# Altium footprint library Minh_Lib.PcbLib: 141 footprints (part 1 of 9)
Each footprint in its own frame and in the unit in brackets; x right, y up, seen from the top. Pads: shape width x height; smd on the part's side, far side on the other; paste and mask are expansions set on the pad; w line width, h text height; cw(c..) or ccw(c..) is an arc to the next point about the centre after c.
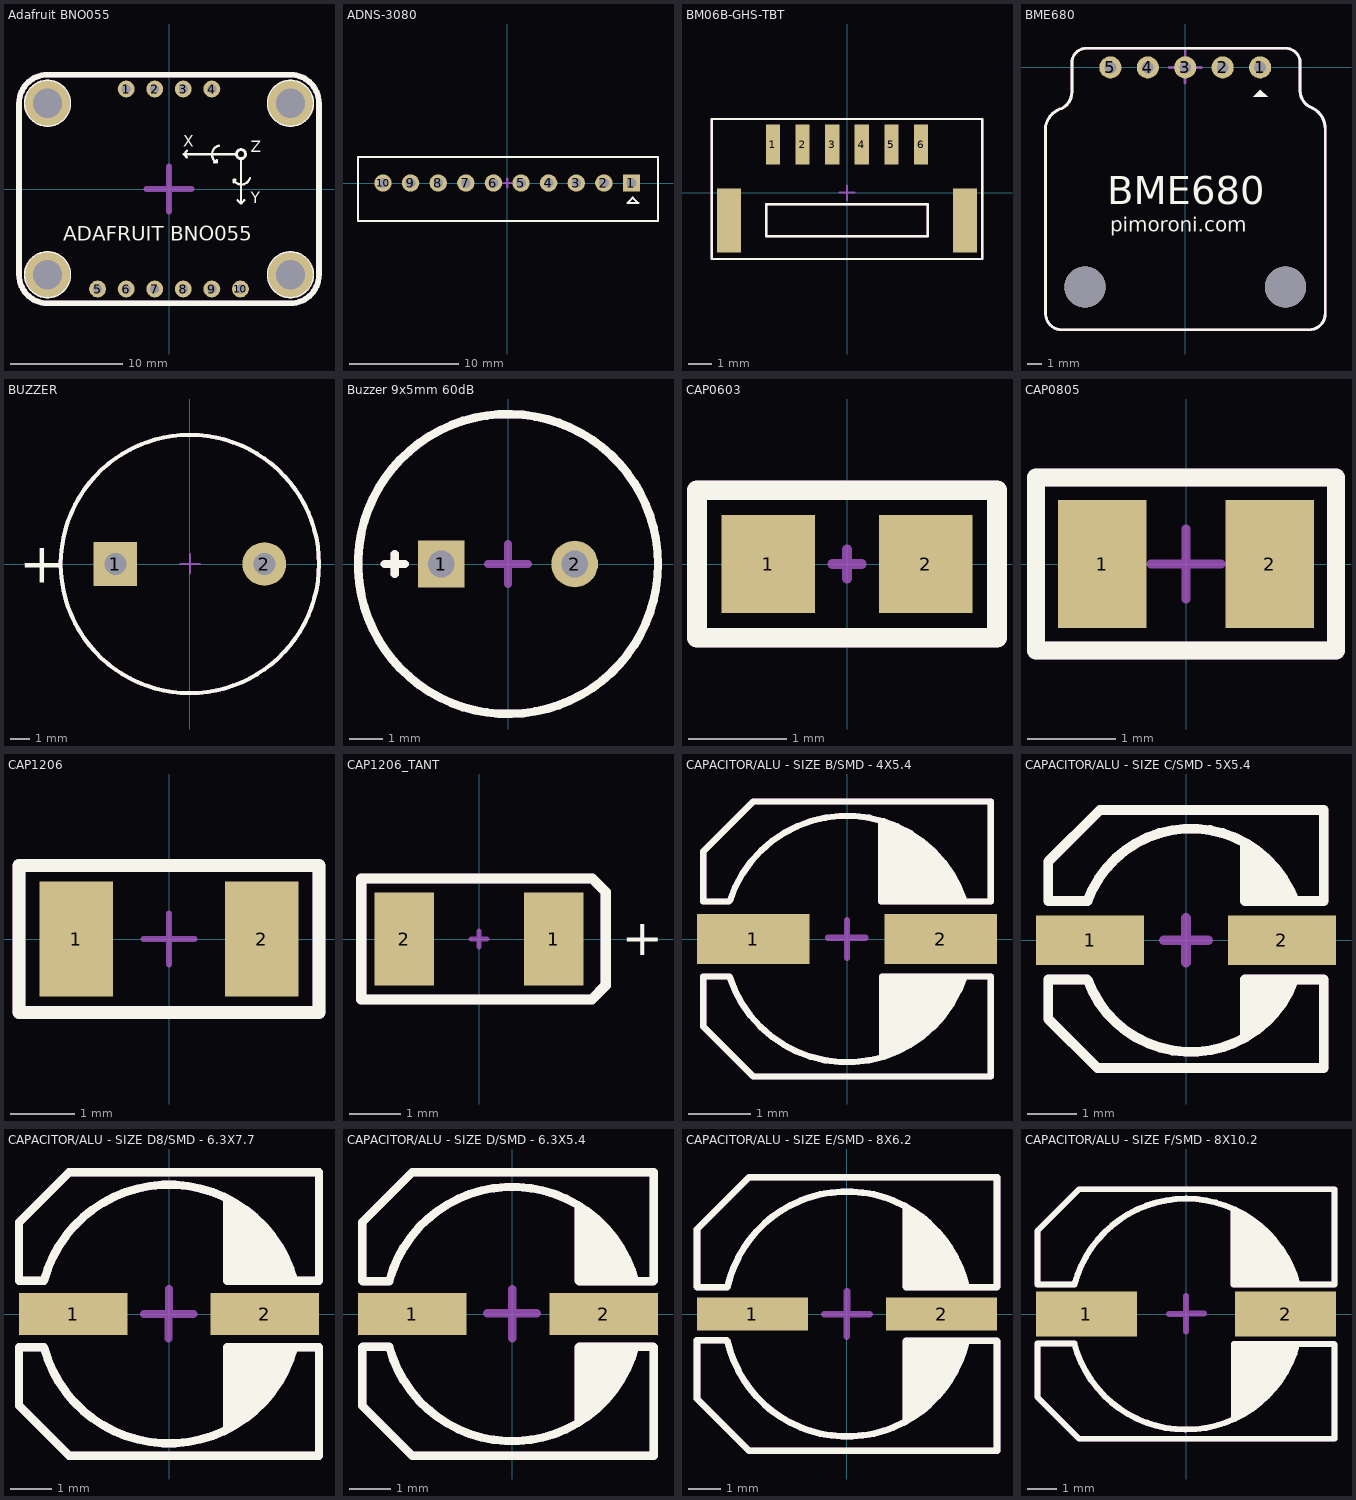
[diagram p0: the footprints below, top view; thin cyan lines are the x and y axes]

## Adafruit BNO055 [mm] "Adafruit BNO055"
pads (14):
  round 1.5 hole 0.8: 1(-3.81,8.89) 2(-1.27,8.89) 3(1.27,8.89) 4(3.81,8.89) 5(-6.35,-8.89) 6(-3.81,-8.89) 7(-1.27,-8.89) 8(1.27,-8.89) 9(3.81,-8.89) 10(6.35,-8.89)
  round 4 hole 2.6: ""(-10.795,-7.62) ""(-10.795,7.62) ""(10.795,-7.62) ""(10.795,7.62)
Top Overlay:
  circle w0.4: c10.795,7.62 r1.9
  circle w0.4: c10.795,-7.62 r1.9
  circle w0.4: c-10.795,-7.62 r1.9
  circle w0.4: c-10.795,7.62 r1.9
  circle w0.254: c6.4,3.1 r0.403
  lines w0.2: 1.603,2.8 1.303,3.1 ; 1.603,3.4 1.303,3.1 ; 4.024,2.374 4.236,2.374 ; 4.236,2.586 4.236,2.374 ; 4.427,3.851 ccw(c4.621,3.075) 4.236,2.374 ; 5.724,0.6 5.724,0.813 ; 5.913,0.813 5.724,0.813 ; 6,3.1 1.303,3.1 ; 6.1,-1 6.4,-1.3 ; 6.4,2.7 6.4,-1.3 ; 6.7,-1 6.4,-1.3 ; 7.194,0.98 cw(c6.425,1.2) 5.724,0.813
  lines w0.5: -13.335,-7.62 ccw(c-10.795,-7.62) -10.795,-10.16 0,-10.16 10.795,-10.16 ccw(c10.795,-7.62) 13.335,-7.62 13.335,0 13.335,7.62 ccw(c10.795,7.62) 10.795,10.16 0,10.16 -10.795,10.16 ccw(c-10.795,7.62) -13.335,7.62 -13.335,0 -13.335,-7.62
  text "ADAFRUIT BNO055" at -9.4,-4.6 h1.3
  text "X" at 1.254,3.754 h1
  text "Z" at 7.254,3.254 h1
  text "Y" at 7.254,-1.246 h1
Mechanical 13:
  text "'.Designator'" at -11.5,-6.8 h3
Mechanical 15:
  circle w0.4: c10.795,7.62 r1.9
  circle w0.4: c10.795,-7.62 r1.9
  circle w0.4: c-10.795,-7.62 r1.9
  circle w0.4: c-10.795,7.62 r1.9
  lines w0.5: -2,0 0,0 ; 0,-2 0,0 ; 0,2 0,0 ; 2,0 0,0 ; -13.335,-7.62 ccw(c-10.795,-7.62) -10.795,-10.16 0,-10.16 10.795,-10.16 ccw(c10.795,-7.62) 13.335,-7.62 13.335,0 13.335,7.62 ccw(c10.795,7.62) 10.795,10.16 0,10.16 -10.795,10.16 ccw(c-10.795,7.62) -13.335,7.62 -13.335,0 -13.335,-7.62
3D body "2472 BNO055 Breakout.step": height 11.23, standoff 7, extent -13.335,-10.16 13.335,10.16
3D body "4x_Male_Pin_2.54_mm.STEP": height 10.04, standoff -1.06, extent -5.08,7.67 5.08,10.07
3D body "6x_Male_Pin_2.54_mm.STEP": height 10.04, standoff -1.06, extent -7.62,-10.09 7.62,-7.69
3D body "4-Pin Header - Female - 2.54mm.step": height 5, standoff -3, extent -5.33,7.62 5.33,10.12
3D body "6-Pin Header - Female - 2.54mm.step": height 5, standoff -3, extent -7.87,-10.14 7.87,-7.64

## ADNS-3080 [mm] "10 PIN DIP"
pads (10):
  rect 1.6x1.6 hole 0.9: 1(11.43,0)
  round 1.6 hole 0.9: 2(8.89,0) 3(6.35,0) 4(3.81,0) 5(1.27,0) 6(-1.27,0) 7(-3.81,0) 8(-6.35,0) 9(-8.89,0) 10(-11.43,0)
Top Overlay:
  lines w0.2: -13.73,-3.5 13.87,-3.5 13.87,2.4 -13.73,2.4 -13.73,-3.5 ; 11.05,-1.85 12.05,-1.85 11.55,-1.35 11.05,-1.85
Mechanical 13:
  lines w0.2: -13.73,-3.5 13.87,-3.5 13.87,2.4 -13.73,2.4 -13.73,-3.5 ; 11.05,-1.85 12.05,-1.85 11.55,-1.35 11.05,-1.85
  text "'.Designator'" at -13.05,-2.4 h1.8
Mechanical 15:
  lines w0.2: -0.4,0 0,0 ; 0,-0.4 0,0 ; 0,0.4 0,0 ; 0.4,0 0,0
3D body "User Library-B10B-XH_mod.step": height 7, standoff -3.3, extent -13.6,-3.4 13.8,2.35

## BM06B-GHS-TBT [mm] "JST - GH - 6 PORT"
pads (8):
  rect 0.6x1.7 smd: 1(-3.125,2.025) 2(-1.875,2.025) 3(-0.625,2.025) 4(0.625,2.025) 5(1.875,2.025) 6(3.125,2.025)
  rect 1x2.7 smd: ""(-4.975,-1.175) ""(4.975,-1.175)
Top Overlay:
  lines w0.1: -3.4,-1.2 -3.4,-1.175 ; -3.4,-0.85 -3.4,-0.8 ; -1.4,-0.5 -1.35,-0.5 ; 1.4,-0.5 1.45,-0.5 ; 2.95,-1.85 3,-1.85 ; 3.35,-1.85 3.4,-1.85 ; 3.4,-1.8 3.4,-1.85 ; 3.4,-1.5 3.4,-1.45 ; 3.4,-1.175 3.4,-1.15 ; 3.4,-1.85 3.4,-0.5 -3.4,-0.5 -3.4,-1.85 3.4,-1.85 ; -5.7,-2.8 -5.7,3.1 -3.1,3.1 5.7,3.1 5.7,-2.8 -5.7,-2.8 ; -3.4,-1.55 -3.4,-1.55
Mechanical 13:
  lines w0.1: -3.4,-1.2 -3.4,-1.175 ; -3.4,-0.85 -3.4,-0.8 ; -1.4,-0.5 -1.35,-0.5 ; 1.4,-0.5 1.45,-0.5 ; 2.95,-1.85 3,-1.85 ; 3.35,-1.85 3.4,-1.85 ; 3.4,-1.8 3.4,-1.85 ; 3.4,-1.5 3.4,-1.45 ; 3.4,-1.175 3.4,-1.15 ; 3.4,-1.85 3.4,-0.5 -3.4,-0.5 -3.4,-1.85 3.4,-1.85 ; -5.7,-2.8 -5.7,3.1 -3.1,3.1 5.7,3.1 5.7,-2.8 -5.7,-2.8 ; -3.4,-1.55 -3.4,-1.55
  text "'.Designator'" at -5.15,-0.1 h1.2
Mechanical 15:
  lines w0.1: -0.3,0 0,0 ; 0,-0.3 0,0 ; 0,0.3 0,0 ; 0.3,0 0,0
3D body "BM06B-GHS-TBT.STEP": height 4.2, standoff -0.01, extent -5.375,-2.3 5.375,2.65

## BME680 [mm] "Pimoroni Robot"
pads (7):
  round 1.5 hole 0.8: 1(5.08,0) 2(2.54,0) 3(0,0) 4(-2.54,0) 5(-5.08,0)
  round 2.8 hole 2.8: ""(-6.8,-14.9) ""(6.8,-14.9)
Top Overlay:
  region: 5.1,-1.5 4.6,-2 5.6,-2
  lines w0.2: -9.48,-4.005 -9.48,-16.7 ccw(c-8.39,-16.71) -8.4,-17.8 8.4,-17.8 ccw(c8.4,-16.7) 9.5,-16.7 9.5,-4.2 ccw(c7.95,-4.15) 8.477,-2.691 ; -9.478,-4.005 cw(c-7.95,-4.27) -8.355,-2.773 ; -8.345,-2.768 ccw(c-8.915,-1.696) -7.701,-1.674 ; -7.7,-1.73 -7.7,0.3 cw(c-6.7,0.3) -6.7,1.3 6.8,1.3 cw(c6.8,0.3) 7.8,0.3 7.8,-1.6 ccw(c9.014,-1.6) 8.599,-2.741
  text "BME680" at -5.3,-9.3 h1.9
  text "pimoroni.com" at -5.1,-11.167 h1
Mechanical 13:
  lines w0.2: -9.48,-4.005 -9.48,-16.7 ccw(c-8.39,-16.71) -8.4,-17.8 8.4,-17.8 ccw(c8.4,-16.7) 9.5,-16.7 9.5,-4.2 ccw(c7.95,-4.15) 8.477,-2.691 ; -9.478,-4.005 cw(c-7.95,-4.27) -8.355,-2.773 ; -8.345,-2.768 ccw(c-8.915,-1.696) -7.701,-1.674 ; -7.7,-1.73 -7.7,0.3 cw(c-6.7,0.3) -6.7,1.3 6.8,1.3 cw(c6.8,0.3) 7.8,0.3 7.8,-1.6 ccw(c9.014,-1.6) 8.599,-2.741
  text "'.Designator'" at -9.2,-16.7 h1.8
Mechanical 15:
  lines w0.2: -1.1,0 0,0 0,1.1 ; -0.004,-1.061 -0.004,0.039 ; -0.004,0 1.096,0
3D body "BME680.STEP": height 8.97, standoff 7.3, extent -9.5,-17.79 9.5,1.21
3D body "User Library-LGA8-3x3mm.STEP": height 9.84, standoff 8.91, extent -1.51,-16.35 1.49,-13.35
3D body "rnd_150-0402y103z250nu.stp": height 9.5, standoff 9, extent 7.5,-6.5 8,-5.5
3D body "User Library-User Library-RES0402-2.STEP": height 9.35, standoff 9, extent -6.75,-6 -6.25,-5
3D body "rnd_150-0402y103z250nu.stp": height 9.5, standoff 9, extent 2.4,-6 2.9,-5
3D body "rnd_150-0402y103z250nu.stp": height 9.5, standoff 9, extent 2.5,-15.3 3,-14.3
3D body "rnd_150-0402y103z250nu.stp": height 9.5, standoff 9, extent -3,-15.3 -2.5,-14.3
3D body "User Library-YC124.STEP": height 9.36, standoff 9, extent -3.7,-6 -1.7,-5
3D body "45965.stp": height 10.11, standoff 8.95, extent -1,-6.95 1.8,-4.05
3D body "CircuitWorks-SOT-23.STEP": height 10.05, standoff 8.95, extent 3.5,-6.75 6.5,-4.25
3D body "User Library-User Library-RES0402-2.STEP": height 9.35, standoff 9, extent -5.25,-6 -4.75,-5
3D body "5-Pin Header - Female - 2.54mm.step": height 5, standoff -3, extent -6.57,-1.25 6.63,1.25
3D body "5x_Male_Pin_2.54_mm.STEP": height 10.11, standoff -0.99, extent -6.35,-1.2 6.35,1.2

## BUZZER [mm]
pads (2):
  rect 2.2x2.2 hole 1.1: 1(-3.75,0)
  round 2.2 hole 1.1: 2(3.75,0)
Top Overlay:
  circle w0.203: c0,0 r6.5
  text "+" at -8.6,-0.95 h2
Mechanical 13:
  circle w0.203: c0,0 r6.5
  text "+" at -8.6,-0.95 h2
  text "'.Designator'" at -5.95,-0.7 h1.5
Mechanical 15:
  lines w0.1: -0.5,0 0,0 0,0.5 ; -0.001,-0.49 -0.001,0.01 0.499,0.01
3D body "Altavoz.STEP": height 5.74, standoff -10.16, extent -6,-5.925 5.85,5.925

## Buzzer 9x5mm 60dB [mm] "9050 DIP"
pads (2):
  rect 1.4x1.4 hole 0.8: 1(-2,0)
  round 1.4 hole 0.8: 2(2,0)
Top Overlay:
  circle w0.254: c0,0 r4.5
  lines w0.254: -3.7,0 -3.4,0 ; -3.4,-0.3 -3.4,0 ; -3.4,0.3 -3.4,0 ; -3.1,0 -3.4,0
Mechanical 13:
  circle w0.254: c0,0 r4.5
  lines w0.254: -3.7,0 -3.4,0 ; -3.4,-0.3 -3.4,0 ; -3.4,0.3 -3.4,0 ; -3.1,0 -3.4,0
  text "'.Designator'" at -3.9,-1.65 h1.5
Mechanical 15:
  lines w0.254: -0.6,0 0,0 ; 0,-0.6 0,0 ; 0,0.6 0,0 ; 0.6,0 0,0
3D body "buzzer.STEP": height 5.5, standoff -4.5, extent -4.5,-4.5 4.5,4.5

## CAP0603 [mm] "Capacitor SMD 0603 ( imperal )"
pads (2):
  rect 0.95x1 smd: 1(-0.8,0) 2(0.8,0)
Top Overlay:
  lines w0.2: -1.525,-0.75 1.525,-0.75 1.525,0.75 -1.525,0.75 -1.525,-0.75
Mechanical 13:
  lines w0.2: -1.525,-0.75 -1.525,0.75 1.525,0.75 1.525,-0.75 -1.525,-0.75
  text "'.Designator'" at -1.325,-0.317 h0.7
Mechanical 15:
  lines w0.1: -0.15,0 0.15,0 ; 0,-0.15 0,0.15
3D body "74467.stp": height 0.9, standoff 0.03, extent -0.875,-0.47 0.875,0.48

## CAP0805 [mm]
pads (2):
  rect 1x1.45 smd: 1(-0.95,0) 2(0.95,0)
Top Overlay:
  lines w0.2: -1.7,-0.98 1.7,-0.98 1.7,0.98 -1.7,0.98 -1.7,-0.98
Mechanical 13:
  lines w0.2: -1.7,-0.98 1.7,-0.98 1.7,0.98 -1.7,0.98 -1.7,-0.98
  text "'.Designator'" at -1.59,-0.647 h0.7
Mechanical 15:
  lines w0.1: -0.4,0 0.4,0 ; 0,-0.4 0,0.4
3D body "74655.stp": height 0.87, standoff -0.01, extent -1.1,-0.72 1.1,0.73

## CAP1206 [mm]
pads (2):
  rect 1.15x1.8 smd: 1(-1.45,0) 2(1.45,0)
Top Overlay:
  lines w0.2: -2.35,-1.15 -2.35,1.15 2.35,1.15 2.35,-1.15 -2.35,-1.15
Mechanical 13:
  lines w0.2: -2.35,-1.15 -2.35,1.15 2.35,1.15 2.35,-1.15 -2.35,-1.15
  text "'.Designator'" at -2.15,-0.717 h0.7
Mechanical 15:
  lines w0.1: -0.4,0 0.4,0 ; 0,-0.4 0,0.4
3D body "User Library-CAPC3216X10.STEP": height 1, standoff 0, extent -1.6,-0.8 1.6,0.8

## CAP1206_TANT [mm]
pads (2):
  rect 1.15x1.8 smd: 1(1.45,0) 2(-1.45,0)
Top Overlay:
  lines w0.1: 2.462,0.85 2.462,0.85
  lines w0.2: -2.288,-1.175 2.187,-1.175 2.462,-0.9 2.462,0.85 2.462,0.9 2.462,0.913 2.2,1.175 -2.288,1.175 -2.288,-1.175
  text "+" at 2.775,-0.317 h0.7
Mechanical 13:
  lines w0.1: 2.462,0.85 2.462,0.85
  lines w0.2: -2.288,-1.175 2.187,-1.175 2.462,-0.9 2.462,0.85 2.462,0.9 2.462,0.913 2.2,1.175 -2.288,1.175 -2.288,-1.175
  text "'.Designator'" at -2.025,-0.242 h0.7
Mechanical 15:
  lines w0.1: -0.15,0 0.15,0 ; 0,-0.15 0,0.15
3D body "User Library-CAP_TAN_C3216_1206.STEP": height 1.81, standoff 0.01, extent -1.7,-0.9 1.7,0.9

## CAPACITOR/ALU - SIZE B/SMD - 4X5.4 [mm] "CAPACITOR  -  ALUMINIUM - SIZE B / EEEFK - SMD"
pads (2):
  rect 1.8x0.8 smd: 1(-1.5,0) 2(1.5,0)
Top Overlay:
  region: 0.563,-1.88 0.563,-0.6 1.872,-0.6 1.81,-0.672 1.77,-0.9 1.56,-1.16 1.56,-1.24 1.21,-1.59 1.045,-1.675 0.82,-1.79
  region: 0.55,0.6 0.55,1.89 0.67,1.89 0.81,1.75 0.99,1.75 1.28,1.46 1.33,1.46 1.64,1.14 1.64,1.09 1.78,0.95 1.879,0.6
  lines w0.1: -1.888,0.6 -2.3,0.6 -2.3,1.4 -1.5,2.2 2.3,2.2 2.3,0.6 1.879,0.6 ; -1.88,-0.6 -2.3,-0.6 -2.3,-1.4 -1.5,-2.2 2.3,-2.2 2.3,-0.6 1.838,-0.6 ; -1.879,-0.6 ccw(c0,0) 1.877,-0.605 ; -1.874,0.613 cw(c0,0) 1.879,0.6 ; 0.55,1.89 0.55,0.6 ; 0.563,-1.88 0.563,-0.6 1.861,-0.6 ; 0.55,0.6 0.55,0.6 ; 0.55,0.6 1.879,0.6
Mechanical 13:
  region: 0.563,-1.88 0.563,-0.6 1.872,-0.6 1.81,-0.672 1.77,-0.9 1.56,-1.16 1.56,-1.24 1.21,-1.59 1.045,-1.675 0.82,-1.79
  region: 0.55,0.6 0.55,1.89 0.67,1.89 0.81,1.75 0.99,1.75 1.28,1.46 1.33,1.46 1.64,1.14 1.64,1.09 1.78,0.95 1.879,0.6
  lines w0.1: -1.888,0.6 -2.3,0.6 -2.3,1.4 -1.5,2.2 2.3,2.2 2.3,0.6 1.879,0.6 ; -1.88,-0.6 -2.3,-0.6 -2.3,-1.4 -1.5,-2.2 2.3,-2.2 2.3,-0.6 1.838,-0.6 ; -1.879,-0.6 ccw(c0,0) 1.877,-0.605 ; -1.874,0.613 cw(c0,0) 1.879,0.6 ; 0.55,1.89 0.55,0.6 ; 0.563,-1.88 0.563,-0.6 1.861,-0.6 ; 0.55,0.6 0.55,0.6 ; 0.55,0.6 1.879,0.6
  text "'.Designator'" at -2.22,-0.27 h0.6
Mechanical 15:
  lines w0.1: -0.304,0.02 -0.004,0.02 0.296,0.02 ; 0,-0.3 0,0 0,0.3
3D body "User Library-capacitor size B.step": height 5.41, standoff -0.01, extent -2.3,-2.15 2.3,2.15

## CAPACITOR/ALU - SIZE C/SMD - 5X5.4 [mm] "CAPACITOR  -  ALUMINIUM - SIZE C / EEEFK - SMD"
pads (2):
  rect 2.2x1 smd: 1(-1.95,0) 2(1.95,0)
Top Overlay:
  region: 1.2,-0.8 1.2,-1.9 1.3,-1.9 1.85,-1.35 1.85,-1.3 2.2,-0.95 2.2,-0.8
  region: 1.2,1.999 1.2,0.801 2.203,0.801 1.799,1.4
  lines w0.2: -2.016,-0.8 -2.4,-0.8 -2.8,-0.8 -2.8,-1.6 -1.8,-2.6 -1.4,-2.6 2.8,-2.6 2.8,-0.8 2.2,-0.8 ; -1.995,-0.821 ccw(c0.099,-0.036) 2.2,-0.8 ; 1.2,-1.9 1.2,-0.8 2.2,-0.8 ; 1.2,1.9 1.2,0.801 2.203,0.801 ; 2.799,0.801 2.203,0.801 ; 2.8,0.8 2.8,2.65 -1.4,2.65 -1.75,2.65 -2.8,1.6 -2.8,0.8 -2.4,0.8 -2,0.8 cw(c0.101,0.036) 2.203,0.801
Mechanical 13:
  region: 1.2,-0.8 1.2,-1.9 1.3,-1.9 1.85,-1.35 1.85,-1.3 2.2,-0.95 2.2,-0.8
  region: 1.2,1.999 1.2,0.801 2.203,0.801 1.799,1.4
  lines w0.2: -2.016,-0.8 -2.4,-0.8 -2.8,-0.8 -2.8,-1.6 -1.8,-2.6 -1.4,-2.6 2.8,-2.6 2.8,-0.8 2.2,-0.8 ; -1.995,-0.821 ccw(c0.099,-0.036) 2.2,-0.8 ; 1.2,-1.9 1.2,-0.8 2.2,-0.8 ; 1.2,1.9 1.2,0.801 2.203,0.801 ; 2.799,0.801 2.203,0.801 ; 2.8,0.8 2.8,2.65 -1.4,2.65 -1.75,2.65 -2.8,1.6 -2.8,0.8 -2.4,0.8 -2,0.8 cw(c0.101,0.036) 2.203,0.801
  text "'.Designator'" at -2.85,-0.633 h0.8
Mechanical 15:
  lines w0.2: -0.45,0 0,0 ; 0,-0.45 0,0 ; 0,0.45 0,0 ; 0.45,0 0,0
3D body "User Library-capacitor size C.step": height 5.45, standoff 0.03, extent -2.9,-2.65 3,2.65

## CAPACITOR/ALU - SIZE D8/SMD - 6.3X7.7 [mm] "CAPACITOR  -  ALUMINIUM - SIZE D8 / EEEFK - SMD"
pads (2):
  rect 2.6x1 smd: 1(-2.3,0) 2(2.3,0)
Top Overlay:
  region: 1.4,2.7 1.4,0.8 3,0.8 2.9,1.2 2.3,2 2.3,2.1
  region: 1.4,-0.8 1.4,-2.7 1.5,-2.6 1.8,-2.6 2.3,-2.1 2.3,-2 2.8,-1.5 2.8,-1.2 3,-1 3,-0.8
  lines w0.2: 1.4,-2.7 1.4,-0.8 3,-0.8 ; 1.4,2.7 1.4,0.8 3,0.8 ; 3,-0.8 cw(c0,0) -3,-0.8 -3.6,-0.8 -3.6,-2.2 -2.4,-3.4 3.6,-3.4 3.6,-0.8 3,-0.8 ; 3,0.8 ccw(c0,0) -3,0.8 -3.6,0.8 -3.6,2.2 -2.4,3.4 3.6,3.4 3.6,0.8 3,0.8
Mechanical 13:
  region: 1.4,2.7 1.4,0.8 3,0.8 2.9,1.2 2.3,2 2.3,2.1
  region: 1.4,-0.8 1.4,-2.7 1.5,-2.6 1.8,-2.6 2.3,-2.1 2.3,-2 2.8,-1.5 2.8,-1.2 3,-1 3,-0.8
  lines w0.2: 1.4,-2.7 1.4,-0.8 3,-0.8 ; 1.4,2.7 1.4,0.8 3,0.8 ; 3,-0.8 cw(c0,0) -3,-0.8 -3.6,-0.8 -3.6,-2.2 -2.4,-3.4 3.6,-3.4 3.6,-0.8 3,-0.8 ; 3,0.8 ccw(c0,0) -3,0.8 -3.6,0.8 -3.6,2.2 -2.4,3.4 3.6,3.4 3.6,0.8 3,0.8
  text "'.Designator'" at -3.5,-0.3 h1.2
Mechanical 15:
  lines w0.2: -0.6,0 0,0 0,0.6 ; -0.013,-0.586 -0.013,0.014 ; -0.013,0 0.587,0
3D body "User Library-capacitor size D8.step": height 7.71, standoff -0.01, extent -3.5,-3.3 3.5,3.3

## CAPACITOR/ALU - SIZE D/SMD - 6.3X5.4 [mm] "CAPACITOR  -  ALUMINIUM - SIZE D / EEEFK - SMD"
pads (2):
  rect 2.6x1 smd: 1(-2.4,0) 2(2.2,0)
Top Overlay:
  region: 1.6,-2.6 1.6,-0.8 1.613,-0.787 2.95,-0.787 2.95,-1.05 2.7,-1.5
  region: 1.6,2.6 1.6,0.8 1.613,0.787 2.95,0.787 2.95,1.05 2.6,1.6 2.4,1.8
  lines w0.2: -3.6,-0.8 -3.6,-2.2 -2.4,-3.4 3.4,-3.4 3.4,-0.8 ; -3.6,0.8 -3.6,2.2 -2.4,3.4 3.4,3.4 3.4,0.8 ; -3.587,-0.787 -2.95,-0.787 ccw(c0,0) 2.95,-0.787 ; -3.587,0.787 -2.95,0.787 cw(c0,0) 2.95,0.787 ; 1.6,-2.6 1.6,-0.8 1.613,-0.787 2.95,-0.787 ; 1.6,2.6 1.6,0.8 1.613,0.787 2.95,0.787 ; 3.387,-0.787 2.95,-0.787 ; 3.387,0.787 2.95,0.787
Mechanical 13:
  region: 1.6,-2.6 1.6,-0.8 1.613,-0.787 2.95,-0.787 2.95,-1.05 2.7,-1.5
  region: 1.6,2.6 1.6,0.8 1.613,0.787 2.95,0.787 2.95,1.05 2.6,1.6 2.4,1.8
  lines w0.2: -3.6,-0.8 -3.6,-2.2 -2.4,-3.4 3.4,-3.4 3.4,-0.8 ; -3.6,0.8 -3.6,2.2 -2.4,3.4 3.4,3.4 3.4,0.8 ; -3.587,-0.787 -2.95,-0.787 ccw(c0,0) 2.95,-0.787 ; -3.587,0.787 -2.95,0.787 cw(c0,0) 2.95,0.787 ; 1.6,-2.6 1.6,-0.8 1.613,-0.787 2.95,-0.787 ; 1.6,2.6 1.6,0.8 1.613,0.787 2.95,0.787 ; 3.387,-0.787 2.95,-0.787 ; 3.387,0.787 2.95,0.787
  text "'.Designator'" at -3.45,-0.3 h1.2
Mechanical 15:
  lines w0.2: -0.598,0.017 0.002,0.017 ; -0.007,0.017 0.593,0.017 ; 0,-0.583 0,0.017 ; 0,0 0,0.6
3D body "User Library-capacitor size D.step": height 5.45, standoff 0.03, extent -3.6,-3.3 3.4,3.3

## CAPACITOR/ALU - SIZE E/SMD - 8X6.2 [mm] "CAPACITOR  -  ALUMINIUM - SIZE E / EEEFK - SMD"
pads (2):
  rect 3.4x1 smd: 1(-2.9,0) 2(2.9,0)
Top Overlay:
  region: 1.8,-3.298 1.8,-0.83 3.653,-0.83 3.6,-0.883 3.6,-1.3 3.3,-1.6 3.3,-1.9 3,-2.2 3,-2.3 2.9,-2.3 2.7,-2.5
  region: 1.8,3.298 1.8,0.83 1.815,0.815 3.668,0.815 3.668,1.032 3.5,1.2 3.5,1.6 3,2.1 3,2.3 2.8,2.5
  lines w0.2: -3.683,-0.8 -4.6,-0.8 -4.6,-2.6 -3,-4.2 4.6,-4.2 4.6,-0.83 4.585,-0.815 3.668,-0.815 ; -3.668,-0.815 ccw(c0,0) 3.668,-0.815 ; 1.8,-3.3 1.8,-0.83 1.815,-0.815 3.668,-0.815 ; 1.8,3.3 1.8,0.83 1.815,0.815 3.668,0.815 ; 3.668,0.815 ccw(c0,0) -3.668,0.815 -4.585,0.815 -4.6,0.83 -4.6,2.6 -3,4.2 4.4,4.2 4.6,4.2 4.6,0.83 4.585,0.815 3.668,0.815
Mechanical 13:
  region: 1.8,-3.298 1.8,-0.83 3.653,-0.83 3.6,-0.883 3.6,-1.3 3.3,-1.6 3.3,-1.9 3,-2.2 3,-2.3 2.9,-2.3 2.7,-2.5
  region: 1.8,3.298 1.8,0.83 1.815,0.815 3.668,0.815 3.668,1.032 3.5,1.2 3.5,1.6 3,2.1 3,2.3 2.8,2.5
  lines w0.2: -3.683,-0.8 -4.6,-0.8 -4.6,-2.6 -3,-4.2 4.6,-4.2 4.6,-0.83 4.585,-0.815 3.668,-0.815 ; -3.668,-0.815 ccw(c0,0) 3.668,-0.815 ; 1.8,-3.3 1.8,-0.83 1.815,-0.815 3.668,-0.815 ; 1.8,3.3 1.8,0.83 1.815,0.815 3.668,0.815 ; 3.668,0.815 ccw(c0,0) -3.668,0.815 -4.585,0.815 -4.6,0.83 -4.6,2.6 -3,4.2 4.4,4.2 4.6,4.2 4.6,0.83 4.585,0.815 3.668,0.815
  text "'.Designator'" at -4.5,-0.3 h1.2
Mechanical 15:
  lines w0.2: -0.7,-0.011 -0.004,-0.011 -0.004,-0.7 ; -0.004,-0.007 0.7,-0.007 ; 0,0 0,0.7
3D body "User Library-capacitor size E.step": height 6.2, standoff -0.01, extent -4.5,-4.15 4.5,4.15

## CAPACITOR/ALU - SIZE F/SMD - 8X10.2 [mm] "CAPACITOR  -  ALUMINIUM - SIZE F / EEEFK - SMD"
pads (2):
  rect 3.4x1.5 smd: 1(-3.35,0) 2(3.35,0)
Top Overlay:
  region: 1.615,-3.485 1.615,-1.015 3.749,-1.015 3.6,-1.164 3.6,-1.6 3.4,-1.8 3.4,-2 3,-2.4 3,-2.5 2.5,-3 2.4,-3 2.1,-3.3
  region: 1.6,3.5 1.6,1 1.612,0.988 3.755,0.988 3.755,1.245 3.5,1.5 3.5,1.8 3.2,2.1 3.2,2.3 2.6,2.9 2.3,3.2
  lines w0.2: -5,-1 -5,-2.8 -3.6,-4.2 5,-4.2 5,-1.03 4.985,-1.015 3.749,-1.015 ; -4.999,-0.999 -3.757,-0.999 ccw(c-0.002,-0.01) 3.749,-1.015 ; -3.751,1 -5,1 -5,2.8 -3.6,4.2 5,4.2 5,1 ; -3.751,1.005 cw(c0,0) 3.755,0.988 ; 1.6,3.5 1.6,1 1.612,0.988 3.755,0.988 ; 1.615,-3.485 1.615,-1.015 3.749,-1.015 ; 4.988,0.988 3.755,0.988
Mechanical 13:
  region: 1.615,-3.485 1.615,-1.015 3.749,-1.015 3.6,-1.164 3.6,-1.6 3.4,-1.8 3.4,-2 3,-2.4 3,-2.5 2.5,-3 2.4,-3 2.1,-3.3
  region: 1.6,3.5 1.6,1 1.612,0.988 3.755,0.988 3.755,1.245 3.5,1.5 3.5,1.8 3.2,2.1 3.2,2.3 2.6,2.9 2.3,3.2
  lines w0.2: -5,-1 -5,-2.8 -3.6,-4.2 5,-4.2 5,-1.03 4.985,-1.015 3.749,-1.015 ; -4.999,-0.999 -3.757,-0.999 ccw(c-0.002,-0.01) 3.749,-1.015 ; -3.751,1 -5,1 -5,2.8 -3.6,4.2 5,4.2 5,1 ; -3.751,1.005 cw(c0,0) 3.755,0.988 ; 1.6,3.5 1.6,1 1.612,0.988 3.755,0.988 ; 1.615,-3.485 1.615,-1.015 3.749,-1.015 ; 4.988,0.988 3.755,0.988
  text "'.Designator'" at -4.9,-0.433 h1.4
Mechanical 15:
  lines w0.2: -0.573,0.007 0.027,0.007 ; 0,-0.593 0,0.007 ; 0,0 0,0.6 ; 0.02,0.021 0.613,0.021
3D body "User Library-capacitor size F.step": height 10.25, standoff 0.03, extent -4.95,-4.15 4.95,4.15